# Altium footprint library MS-Electronic.PcbLib: 213 footprints (part 13 of 14)
Each footprint in its own frame and in the unit in brackets; x right, y up, seen from the top. Pads: shape width x height; smd on the part's side, far side on the other; paste and mask are expansions set on the pad; w line width, h text height; cw(c..) or ccw(c..) is an arc to the next point about the centre after c.
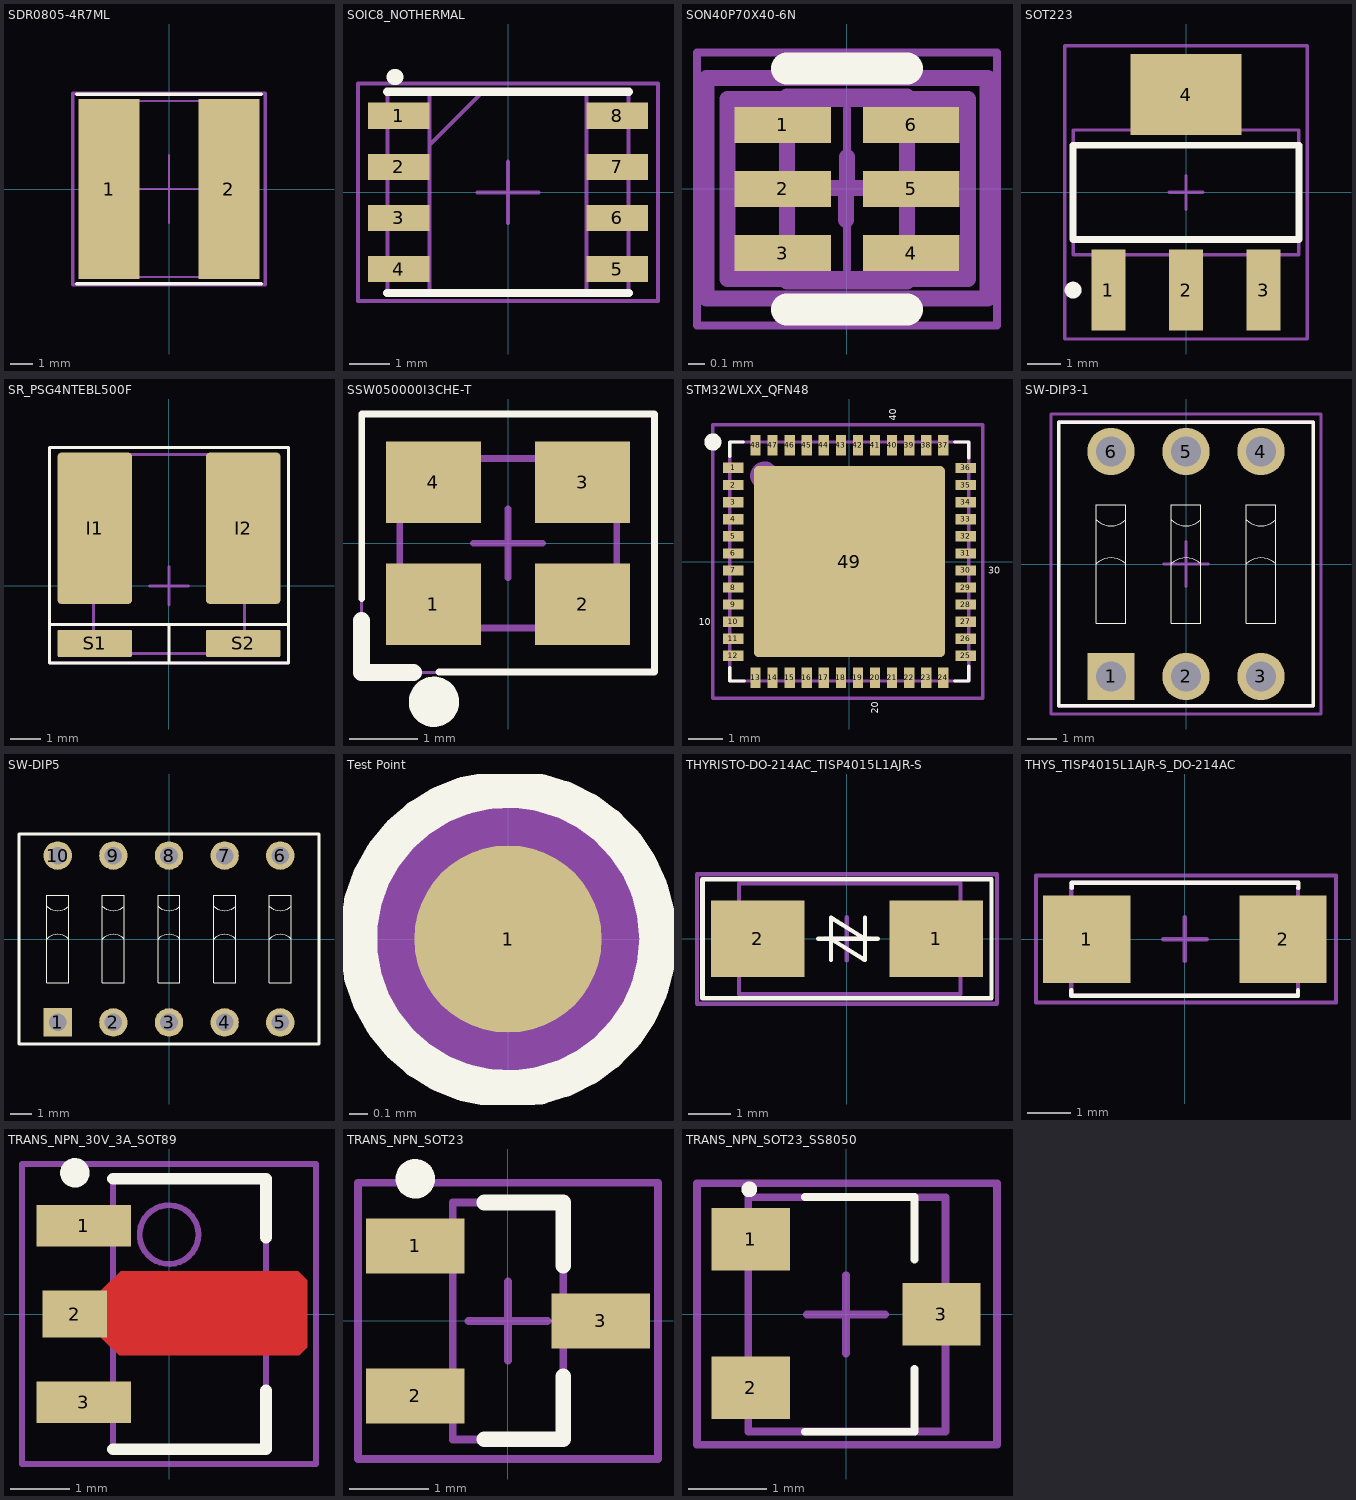
[diagram p12: the footprints below, top view; thin cyan lines are the x and y axes]

## SDR0805-4R7ML [mil]
pads (2):
  rect 106.5x315 smd paste+0: 1(-104.5,0) 2(104.5,0)
Top Overlay:
  lines w6: -161.42,-165.35 161.42,-165.35 ; -161.42,165.35 161.42,165.35
Top Assembly:
  lines w3.94: -153.54,-153.54 -153.54,153.54 153.54,153.54 153.54,-153.54 -153.54,-153.54
  text ".Designator" at -118.07,-7.87 h23.62
Top Component Center (Mech15):
  lines w3.94: -59.06,0 0,0 ; 0,-59.06 0,0 ; 0,59.06 0,0 ; 59.06,0 0,0
  lines w6: -167.75,-167.5 167.75,-167.5 167.75,167.5 -167.75,167.5 -167.75,-167.5
3D body "sdr0805-4r7ml.stp": height 208.66, standoff 0, extent -153.54,-153.54 153.54,153.54

## SOIC8_NOTHERMAL [mm]
pads (8):
  rect 1.525x0.65 smd: 1(-2.712,1.905) 2(-2.712,0.635) 3(-2.712,-0.635) 4(-2.712,-1.905) 5(2.712,-1.905) 6(2.712,-0.635) 7(2.712,0.635) 8(2.712,1.905)
Top Overlay:
  lines w0.2: -3,-2.5 3,-2.5 ; -3,2.5 3,2.5
  lines w0.4: -2.819,2.87 -2.794,2.87
Top Assembly:
  lines w0.1: -2.997,-2.54 -2.997,2.489 2.997,2.489 2.997,-2.54 -2.997,-2.54
  text ".Designator" at -4.998,-0.333 h1
Top 3D Body:
  lines w0.1: -1.95,1.18 -0.68,2.45 ; -1.95,-2.45 1.95,-2.45 1.95,2.45 -1.95,2.45 -1.95,-2.45
Top Component Center (Mech15):
  lines w0.1: -0.762,0 0,0 ; 0,-0.762 0,0 ; 0,0.762 0,0 ; 0.762,0 0,0 ; -3.725,-2.7 3.725,-2.7 3.725,2.7 -3.725,2.7 -3.725,-2.7
3D body "NE555DR.stp": height 1.75, standoff 0, extent -3,-2.45 3,2.45

## SON40P70X40-6N [mm] "SON, 6-Leads, Body 1.10x0.70mm, Pitch 0.40mm"
height 0.4
pads (6):
  rect 0.6x0.225 smd: 1(-0.4,0.4) 2(-0.4,0) 3(-0.4,-0.4) 4(0.4,-0.4) 5(0.4,0) 6(0.4,0.4)
Top Overlay:
  lines w0.2: -0.375,-0.75 0.375,-0.75 ; -0.375,0.75 0.375,0.75
  text "." at -1.2,0.855 h3
Top Assembly:
  lines w0.1: -0.745,-0.561 0.753,-0.561 0.753,0.56 -0.745,0.56 -0.745,-0.561
  text ".Designator" at -1.999,-0.133 h0.4
Bottom 3D Body:
  lines w0.1: -0.375,-0.575 -0.375,0.575 0.375,0.575 0.375,-0.575 -0.375,-0.575
  text "." at -0.325,0.55 h4
Top Component Center (Mech15):
  lines w0.1: -0.204,0.008 -0.004,0.008 ; -0.007,-0.192 -0.007,0.008 0.193,0.008 ; 0,0 0,0.2 ; -0.874,-0.682 0.877,-0.682 0.877,0.692 -0.874,0.692 -0.874,-0.682
Mechanical 17:
  lines w0.05: -0.5,0 0.5,0 ; 0,-0.5 0,0.5 ; -0.935,-0.85 -0.935,0.85 0.935,0.85 0.935,-0.85 -0.935,-0.85
3D body "SON40P70X40-6N.step": height 0.4, standoff 0, extent -0.376,-0.575 0.376,0.575

## SOT223 [mm]
pads (4):
  rect 1x2.4 smd: 1(-2.3,-2.9) 2(0,-2.9) 3(2.3,-2.9)
  rect 3.3x2.4 smd: 4(0,2.9)
Top Overlay:
  circle w0.25: c-3.35,-2.9 r0.125
  lines w0.2: -3.35,-1.4 -3.35,1.4 3.35,1.4 3.35,-1.4 -3.35,-1.4
Top Assembly:
  lines w0.1: -3.35,-1.85 3.35,-1.85 3.35,1.85 -3.35,1.85 -3.35,-1.85
  text ".Designator" at -4.998,-0.333 h1
Top Component Center (Mech15):
  lines w0.1: -0.5,0 0.5,0 ; 0,-0.5 0,0.5 ; -3.6,-4.35 -3.6,4.35 3.6,4.35 3.6,-4.35 -3.6,-4.35
3D body "SW3DPS-SOT-223-DEFAULT.step": height 1.68, standoff 0, extent -3.25,-3.556 3.25,3.404

## SR_PSG4NTEBL500F [mm]
pads (4):
  rrect10% 2.45x5 smd mask+0.07: I1(-2.45,1.9) I2(2.45,1.9)
  rrect10% 2.45x0.9 smd mask+0.07: S1(-2.45,-1.9) S2(2.45,-1.9)
Top Overlay:
  lines w0.1: -3.937,-1.27 3.937,-1.27 ; 0,-2.545 0,-1.27 ; 0,-1.27 0,-1.27 ; -3.937,-2.545 3.937,-2.545 3.937,4.567 -3.937,4.567 -3.937,-2.545
Top Assembly:
  lines w0.1: -3.454,-2.24 -3.454,-1.554 -2.489,-1.554 -2.489,-0.538 -3.454,-0.538 -3.454,4.338 3.454,4.338 3.454,-0.548 2.499,-0.548 2.499,-1.554 3.454,-1.554 3.454,-2.24 -3.454,-2.24
  text ".Designator" at -2.499,-0.167 h0.5
Top Component Center (Mech15):
  lines w0.1: -0.635,0 0,0 ; 0,-0.635 0,0 ; 0,0.635 0,0 ; 0.635,0 0,0 ; -3.937,-2.545 3.937,-2.545 3.937,4.567 -3.937,4.567 -3.937,-2.545
3D body: height 3, standoff 0, extent -3.45,-2.25 3.45,4.35

## SSW050000I3CHE-T [mm]
pads (4):
  rect 1.4x1.2 smd: 1(-1.1,-0.9) 2(1.1,-0.9) 3(1.1,0.9) 4(-1.1,0.9)
Top Overlay:
  circle w0.381: c-1.092,-2.337 r0.18
  lines w0.1: -2.156,-0.817 -2.156,1.905 2.159,1.905 2.159,-1.898 -1.018,-1.898
  lines w0.254: -2.159,-1.143 -2.159,-1.905 -1.397,-1.905
Top Assembly:
  lines w0.1: -1.595,-1.25 -1.595,1.251 1.601,1.251 1.601,-1.25 -1.595,-1.25
  text ".Designator" at -2.999,-0.2 h0.6
Top Component Center (Mech15):
  lines w0.05: -2.159,-1.905 -2.159,1.905 2.159,1.905 2.159,-1.905 -2.159,-1.905
  lines w0.1: -0.508,0 0,0 ; 0,-0.508 0,0 ; 0,0.508 0,0 ; 0.508,0 0,0
3D body "User Library-Crystal SMD C3225.step": height 0.81, standoff 0, extent -1.6,-1.25 1.6,1.25

## STM32WLXX_QFN48 [mm] "QFN48 7x7x0.55mm pitch 0.5mm"
height 0.55
pads (49):
  rect 0.6x0.3 smd mask+0.06: 1(-3.398,2.746) 2(-3.398,2.239) 3(-3.398,1.739) 4(-3.398,1.239) 5(-3.398,0.739) 6(-3.398,0.239) 7(-3.398,-0.261) 8(-3.398,-0.761) 9(-3.398,-1.261) 10(-3.398,-1.761) 11(-3.398,-2.261) 12(-3.398,-2.761) 25(3.398,-2.761) 26(3.398,-2.261) 27(3.398,-1.761) 28(3.398,-1.261) 29(3.398,-0.761) 30(3.398,-0.261) 31(3.398,0.239) 32(3.398,0.739) 33(3.398,1.239) 34(3.398,1.739) 35(3.398,2.239) 36(3.398,2.739)
  rect 0.3x0.6 smd mask+0.06: 13(-2.752,-3.399) 14(-2.252,-3.399) 15(-1.752,-3.399) 16(-1.252,-3.399) 17(-0.752,-3.399) 18(-0.252,-3.399) 19(0.248,-3.399) 20(0.748,-3.399) 21(1.248,-3.399) 22(1.748,-3.399) 23(2.248,-3.399) 24(2.748,-3.399) 37(2.748,3.399) 38(2.248,3.399) 39(1.748,3.399) 40(1.248,3.399) 41(0.748,3.399) 42(0.248,3.399) 43(-0.252,3.399) 44(-0.752,3.399) 45(-1.252,3.399) 46(-1.752,3.399) 47(-2.252,3.399) 48(-2.752,3.399)
  rrect5% 5.6x5.6 smd paste-3 mask+0.08: 49(0,0)
Top Overlay:
  circle w0.3: c-4,3.5 r0.1
  lines w0.025: -3.502,3.489 -3.502,3.501 ; 3.077,3.501 3.498,3.501
  lines w0.1: -3.502,3.079 -3.502,3.501 -3.106,3.501 ; 3.077,-3.499 3.498,-3.499 ; 3.077,3.501 3.498,3.501 3.498,3.044 ; -3.502,-3.499 -3.079,-3.499 -3.502,-3.499 ; -3.502,-3.499 -3.502,-3.103 -3.502,-3.499 ; 3.498,-3.499 3.498,-3.067 3.498,-3.499
  text "40" at 1.37,4.12 h0.2
  text "30" at 4.07,-0.357 h0.2
  text "20" at 0.842,-4.464 h0.2
  text "10" at -4.415,-1.869 h0.2
Top Paste:
  rectangle: 1.092,-2.488 2.542,-1.038
  rectangle: -0.712,-2.488 0.738,-1.038
  rectangle: -2.492,-2.488 -1.042,-1.038
  rectangle: -2.492,-0.71 -1.042,0.74
  rectangle: -0.712,-0.71 0.738,0.74
  rectangle: 1.092,-0.71 2.542,0.74
  rectangle: -2.493,1.064 -1.043,2.514
  rectangle: -0.713,1.064 0.737,2.514
  rectangle: 1.091,1.064 2.541,2.514
Top Assembly:
  circle w0.254: c-2.493,2.514 r0.288
  lines w0.1: -3.502,-3.499 3.498,-3.499 3.498,3.501 -3.502,3.501 -3.502,-3.499
  text ".Designator" at -2.499,-0.167 h0.5
Top Component Center (Mech15):
  lines w0.1: -0.6,0 0,0 ; 0,-0.6 0,0 ; 0,0.6 0,0 ; 0.6,0 0,0 ; -4,-4 -4,4 3.9,4 3.9,-4 -4,-4
3D body "User Library-QFN48_7x7.step": height 0.78, standoff -0.02, extent -3.512,-3.509 3.508,3.511

## SW-DIP3-1 [mm] "03p, 2.54mm Pitch, Horizontal, Box Type, THT, flat Actuator, red, without Tape, Tube"
height 5.2
pads (6):
  rect 1.6x1.6 hole 1: 1(-2.54,-3.81)
  round 1.6 hole 1: 2(0,-3.81) 3(2.54,-3.81) 4(2.54,3.81) 5(0,3.81) 6(-2.54,3.81)
Top Overlay:
  lines w0.025: -3.04,0 cw(c-2.54,-0.5) -2.04,0 ; -3.04,1.5 ccw(c-2.54,2) -2.04,1.5 ; -0.5,0 cw(c0,-0.5) 0.5,0 ; -0.5,1.5 ccw(c0,2) 0.5,1.5 ; 2.04,0 cw(c2.54,-0.5) 3.04,0 ; 2.04,1.5 ccw(c2.54,2) 3.04,1.5 ; -3.04,-2 -2.04,-2 -2.04,2 -3.04,2 -3.04,-2 ; -0.5,-2 0.5,-2 0.5,2 -0.5,2 -0.5,-2 ; 2.04,-2 3.04,-2 3.04,2 2.04,2 2.04,-2
  lines w0.127: -4.31,-4.8 -4.31,4.8 ; -4.31,-4.8 4.31,-4.8 ; -4.31,-4.8 -4.31,4.8 ; -4.31,-4.8 4.31,-4.8 ; -4.31,4.8 4.31,4.8 ; -4.31,4.8 4.31,4.8 ; 4.31,-4.8 4.31,4.8 ; 4.31,-4.8 4.31,4.8
Top Assembly:
  lines w0.1: -4.318,-4.826 -4.318,4.826 4.318,4.826 4.318,-4.826 -4.318,-4.826
  text ".Designator" at -2.499,-0.167 h0.5
Top Component Center (Mech15):
  lines w0.1: -0.762,0 0,0 ; 0,-0.762 0,0 ; 0,0.762 0,0 ; 0.762,0 0,0 ; -4.572,-5.08 -4.572,5.08 4.572,5.08 4.572,-5.08 -4.572,-5.08
3D body "418117170903.stp": height 5.4, standoff -3.8, extent -4.31,-4.8 4.31,4.8

## SW-DIP5 [mm] "05p, 2.54mm Pitch, Horizontal, Box Type, THT, flat Actuator, red, without Tape, Tube"
height 5.2
pads (10):
  rect 1.3x1.3 hole 0.8: 1(-5.08,-3.81)
  round 1.3 hole 0.8: 2(-2.54,-3.81) 3(0,-3.81) 4(2.54,-3.81) 5(5.08,-3.81) 6(5.08,3.81) 7(2.54,3.81) 8(0,3.81) 9(-2.54,3.81) 10(-5.08,3.81)
Top Overlay:
  lines w0.025: -5.58,0 cw(c-5.08,-0.5) -4.58,0 ; -5.58,1.5 ccw(c-5.08,2) -4.58,1.5 ; -3.04,0 cw(c-2.54,-0.5) -2.04,0 ; -3.04,1.5 ccw(c-2.54,2) -2.04,1.5 ; -0.5,0 cw(c0,-0.5) 0.5,0 ; -0.5,1.5 ccw(c0,2) 0.5,1.5 ; 2.04,0 cw(c2.54,-0.5) 3.04,0 ; 2.04,1.5 ccw(c2.54,2) 3.04,1.5 ; 4.58,0 cw(c5.08,-0.5) 5.58,0 ; 4.58,1.5 ccw(c5.08,2) 5.58,1.5 ; -5.58,-2 -5.58,2 -4.58,2 -4.58,-2 -5.58,-2 ; -3.04,-2 -3.04,2 -2.04,2 -2.04,-2 -3.04,-2 ; -0.5,-2 -0.5,2 0.5,2 0.5,-2 -0.5,-2 ; 2.04,-2 2.04,2 3.04,2 3.04,-2 2.04,-2 ; 4.58,-2 4.58,2 5.58,2 5.58,-2 4.58,-2
  lines w0.127: -6.85,-4.8 -6.85,4.8 ; -6.85,-4.8 6.85,-4.8 ; -6.85,-4.8 -6.85,4.8 ; -6.85,-4.8 6.85,-4.8 ; -6.85,4.8 6.85,4.8 ; -6.85,4.8 6.85,4.8 ; 6.85,-4.8 6.85,4.8 ; 6.85,-4.8 6.85,4.8
3D body "418117170905.stp": height 5.4, standoff -3.8, extent -6.85,-4.8 6.85,4.8

## Test Point [mm]
pads (1):
  round 1 smd paste+0: 1(0,0)
Top Overlay:
  circle w0.2: c0,0 r0.8
Top Assembly:
  pour cut-out: 0,-0.721 -0.071,-0.721 -0.21,-0.693 -0.342,-0.639 -0.46,-0.56 -0.56,-0.46 -0.639,-0.342 -0.693,-0.21 -0.721,-0.071 -0.721,0 -0.721,0.071 -0.693,0.21 -0.639,0.342 -0.56,0.46 -0.46,0.56 -0.342,0.639 -0.21,0.693 -0.071,0.721 0,0.721 0.071,0.721 0.21,0.693 0.342,0.639 0.46,0.56 0.56,0.46 0.639,0.342 0.693,0.21 0.721,0.071 0.721,0 0.721,-0.071 0.693,-0.21 0.639,-0.342 0.56,-0.46 0.46,-0.56 0.342,-0.639 0.21,-0.693 0.071,-0.721
  text ".Designator" at -2.499,-0.167 h0.5
Mechanical 17:
  text ".Comment 1" at -1.248,-0.098 h0.64
3D body: height 0.02, standoff 0, extent -0.5,-0.5 0.5,0.5

## THYRISTO-DO-214AC_TISP4015L1AJR-S [mm]
pads (2):
  rect 2.2x1.8 smd mask+0.07: 1(2.1,0) 2(-2.1,0)
Top Overlay:
  lines w0.1: -3.387,-1.4 -3.387,1.4 ; -0.675,0 -0.375,0 ; -0.375,-0.5 -0.375,0 ; 0.425,0.5 0.425,-0.5 -0.375,0 ; 0.725,0 0.425,0 ; -0.375,0 0.425,0 ; -0.375,0 -0.375,0.5 0.425,0 ; -3.4,-1.4 3.4,-1.4 3.4,1.4 -3.4,1.4 -3.4,-1.4
Top Assembly:
  lines w0.1: -2.54,-1.295 -2.54,1.301 2.67,1.301 2.67,-1.295 -2.54,-1.295
  text ".Designator" at -4.998,-0.333 h1
Top Component Center (Mech15):
  lines w0.1: -0.508,0 0,0 ; 0,-0.508 0,0 ; 0,0.508 0,0 ; 0.025,0 0.533,0 ; -3.525,-1.53 -3.525,1.521 3.531,1.521 3.531,-1.53 -3.525,-1.53
3D body "SW3dPS-DO-214AC SMA.STEP": height 2.42, standoff 0.02, extent -2.6,-1.3 2.6,1.3

## THYS_TISP4015L1AJR-S_DO-214AC [mm]
pads (2):
  rect 2x2 smd mask+0.07: 1(-2.25,0) 2(2.25,0)
Top Overlay:
  lines w0.1: -2.601,-1.172 -2.603,-1.172 -2.603,-1.295 2.591,-1.295 2.591,-1.172 ; -2.591,1.172 -2.591,1.295 2.603,1.295 2.603,1.172 2.601,1.172
Top Assembly:
  lines w0.1: -2.603,-1.295 -2.603,1.295 2.591,1.295 2.591,-1.295 -2.603,-1.295
  text ".Designator" at -3.019,-0.33 h1.4
Top Component Center (Mech15):
  lines w0.1: -0.5,0 0.5,0 ; 0,-0.5 0,0.5 ; -3.414,-1.452 -3.414,1.458 3.463,1.458 3.463,-1.452 -3.414,-1.452
3D body "SMA_nominal.stp": height 2.42, standoff 0.02, extent -2.615,-1.3 2.585,1.3

## TRANS_NPN_30V_3A_SOT89 [mm]
height 1.6
pads (3):
  rect 1.6x0.7 smd: 1(-1.45,1.5) 3(-1.45,-1.5)
  rect 1.1x0.8 smd: 2(-1.6,0)
Top Layer:
  region: -1.15,0.4 -0.824,0.726 2.198,0.726 2.353,0.57 2.353,-0.563 2.212,-0.705 -0.845,-0.705 -1.15,-0.4
Top Overlay:
  circle w0.25: c-1.6,2.4 r0.125
  lines w0.2: -0.95,-2.3 1.65,-2.3 1.65,-1.3 ; -0.95,2.3 1.65,2.3 1.65,1.3
Top Assembly:
  circle w0.1: c0,1.35 r0.5
  lines w0.1: -0.95,-2.3 -0.95,2.3 1.65,2.3 1.65,-2.3 -0.95,-2.3
  text ".Designator" at -2.999,-0.2 h0.6
Top Component Center (Mech15):
  lines w0.1: -0.15,0 0.85,0 ; 0.35,-0.5 0.35,0.5 ; -2.5,-2.55 -2.5,2.55 2.5,2.55 2.5,-2.55 -2.5,-2.55
3D body "TRANS_NPN_30V_3A_SOT89.step": height 1.6, standoff 0, extent -2.202,-2.329 1.948,2.264

## TRANS_NPN_SOT23 [mm]
height 1.2
pads (3):
  rect 1.25x0.7 smd: 1(-1.175,0.95) 2(-1.175,-0.95) 3(1.175,0)
Top Overlay:
  circle w0.25: c-1.175,1.8 r0.125
  lines w0.2: -0.3,-1.5 0.7,-1.5 0.7,-0.7 ; -0.3,1.5 0.7,1.5 0.7,0.7
Top Assembly:
  lines w0.1: -0.7,-1.5 -0.7,1.5 0.7,1.5 0.7,-1.5 -0.7,-1.5
  text ".Designator" at -2.999,-0.2 h0.6
Top Component Center (Mech15):
  lines w0.1: -0.5,0 0.5,0 ; 0,-0.5 0,0.5 ; -1.9,-1.75 -1.9,1.75 1.9,1.75 1.9,-1.75 -1.9,-1.75
3D body "TRANS_NPN_SOT23.step": height 1.2, standoff 0, extent -1.3,-1.5 1.3,1.5

## TRANS_NPN_SOT23_SS8050 [mm]
pads (3):
  rect 1x0.8 smd: 1(-1.219,0.96) 2(-1.219,-0.94) 3(1.219,0)
Top Overlay:
  circle w0.1: c-1.236,1.599 r0.05
  lines w0.1: -0.525,-1.5 0.875,-1.5 0.875,-0.7 ; -0.525,1.5 0.875,1.5 0.875,0.7
Top Assembly:
  lines w0.1: -1.251,-1.499 1.27,-1.499 1.27,1.499 -1.251,1.499 -1.251,-1.499
  text ".Designator" at -2.999,-0.2 h0.6
Top Component Center (Mech15):
  lines w0.1: -0.5,0 0.5,0 ; 0,-0.5 0,0.5 ; -1.905,-1.666 -1.905,1.676 1.93,1.676 1.93,-1.666 -1.905,-1.666
3D body "SW3DPS-SOT-23-DEFAULT.STEP": height 1.1, standoff 0, extent -1.25,-1.5 1.25,1.5

## TRANS_NPN_SOT89 [mm]